# Altium footprint library connecteurs.PcbLib: 162 footprints (part 11 of 11)
Each footprint in its own frame and in the unit in brackets; x right, y up, seen from the top. Pads: shape width x height; smd on the part's side, far side on the other; paste and mask are expansions set on the pad; w line width, h text height; cw(c..) or ccw(c..) is an arc to the next point about the centre after c.
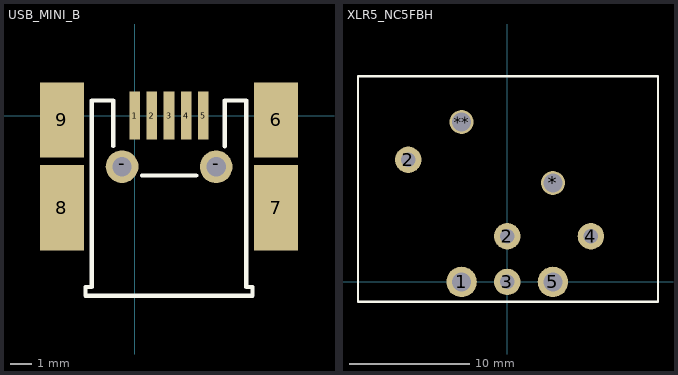
[diagram p10: the footprints below, top view; thin cyan lines are the x and y axes]

## USB_MINI_B [mm] "USB ; CMS ; TYPE B ; PAS = 0.8 mm"
height 3.95
pads (11):
  rect 0.5x2.25 smd: 1(0,0) 2(0.8,0) 3(1.6,0) 4(2.4,0) 5(3.2,0)
  rect 2.05x3.5 smd: 6(6.6,-0.2) 9(-3.4,-0.2)
  rect 2.05x4 smd: 7(6.6,-4.3) 8(-3.4,-4.3)
  round 1.524 hole 0.9: -(-0.59,-2.38) -(3.8,-2.39)
Top Overlay:
  lines w0.2: -1,-1.42 -1,0.7 -2,0.7 -2,-8 -2.3,-8 -2.3,-8.4 5.5,-8.4 5.5,-8 5.2,-8 5.2,0.7 4.2,0.7 4.2,-1.43 ; 0.34,-2.8 2.87,-2.8
3D body: height 0.6, standoff -4.35, extent -3.77,-8.28 6.93,0.92

## XLR5_NC5FBH [mm] "connecteur XLR5 - 5 points - NC5FBH - neutrik"
height 25
pads (8):
  round 2.54 hole 1.6: 1(-3.81,0) 5(3.81,0)
  round 2.2 hole 1.2: 2(-8.255,10.185) 2(0,3.81) 4(6.98,3.81)
  round 2.2 hole 1.199: 3(0,0)
  round 2 hole 1.6: *(3.81,8.255) **(-3.81,13.335)
Top Overlay:
  lines w0.2: -12.446,-1.651 12.573,-1.651 12.573,17.15 -12.446,17.15 -12.446,-1.651